# Altium integrated library Lattice CPLD ispLSI.IntLib: 471 symbols (part 23 of 26) (continued)
## ispLSI8600V-125LB492 (continued)
part C pins: E1 I/OG5 <3> (io), E2 I/OG5 <2> (io), E3 I/OG5 <1> (io), E4 I/OG5 <0> (io), F1 I/OG5 <7> (io), F2 I/OG5 <6> (io), F3 I/OG5 <5> (io), F4 I/OG5 <4> (io), F23 I/OG5 <23> (io), F24 I/OG5 <22> (io), F25 I/OG5 <21> (io), F26 I/OG5 <20> (io), G1 I/OG5 <11> (io), G2 I/OG5 <10> (io), G3 I/OG5 <9> (io), G4 I/OG5 <8> (io), G23 I/OG5 <19> (io), G24 I/OG5 <18> (io), G25 I/OG5 <17> (io), G26 I/OG5 <16> (io), H1 I/OG4 <6> (io), H2 I/OG4 <8> (io), H3 I/OG4 <9> (io), H4 I/OG4 <10> (io), H5 I/OG4 <1> (io), H6 I/OG3 <3> (io), H21 I/OG3 <20> (io), H22 I/OG4 <21> (io), H23 I/OG5 <15> (io), H24 I/OG5 <14> (io), H25 I/OG5 <13> (io), H26 I/OG4 <12> (io), J1 I/OG4 <2> (io), J2 I/OG4 <3> (io), J3 I/OG4 <4> (io), J4 I/OG4 <5> (io), J5 I/OG4 <7> (io), J22 I/OG4 <16> (io), J23 I/OG4 <13> (io), J24 I/OG4 <14> (io), J25 I/OG4 <15> (io), J26 I/OG4 <17> (io), K1 I/OG3 <1> (io), K2 I/OG3 <0> (io), K4 I/OG4 <0> (io), K6 I/OG4 <11> (io), K21 I/OG5 <12> (io), K23 I/OG4 <18> (io), K24 I/OG4 <19> (io), K25 I/OG4 <20> (io), K26 I/OG4 <22> (io), L1 I/OG3 <6> (io), L2 I/OG3 <2> (io), L3 I/OG3 <4> (io), L4 I/OG3 <5> (io), L23 I/OG3 <23> (io), L25 I/OG4 <23> (io), L26 I/OG3 <22> (io), M1 I/OG3 <8> (io), M2 I/OG3 <7> (io), M3 I/OG3 <9> (io), M4 I/OG3 <10> (io), M22 I/OG3 <16> (io), M23 I/OG3 <17> (io), M24 I/OG3 <18> (io), M25 I/OG3 <21> (io), M26 I/OG3 <19> (io), N2 I/OG3 <11> (io), N4 I/OG2 <11> (io), N23 I/OG3 <12> (io), N24 I/OG3 <13> (io), N25 I/OG3 <15> (io), N26 I/OG3 <14> (io), P1 I/OG2 <8> (io), P3 I/OG2 <9> (io), P4 I/OG2 <10> (io), P25 I/OG2 <13> (io), P26 I/OG2 <12> (io), R1 I/OG2 <4> (io), R2 I/OG2 <3> (io), R3 I/OG2 <5> (io), R4 I/OG2 <6> (io), R5 I/OG2 <7> (io), R23 I/OG2 <14> (io), R25 I/OG2 <17> (io), R26 I/OG2 <16> (io), T1 I/OG2 <1> (io), T4 I/OG2 <0> (io), T22 I/OG2 <15> (io), T23 I/OG2 <19> (io), T24 I/OG2 <21> (io), T25 I/OG2 <22> (io), T26 I/OG2 <18> (io), U26 I/OG2 <23> (io), W6 I/OG2 <2> (io), W21 I/OG2 <20> (io)
part D pins: A1 NC, A6 NC, A7 NC, A8 NC, A16 NC, A20 NC, A21 NC, A22 NC, AA8 NC, AA9 NC, AA18 NC, AA19 NC, AB1 NC, AB2 NC, AB3 NC, AB4 NC, AB6 NC, AB10 NC, AB20 NC, AB21 NC, AB23 NC, AC1 NC, AC2 NC, AC3 NC, AC6 NC, AC7 NC, AC8 NC, AC18 NC, AC19 NC, AC20 NC, AC23 NC, AC24 NC, AC25 NC, AC26 NC, AD1 NC, AD2 NC, AD3 NC, AD6 NC, AD7 NC, AD8 NC, AD15 NC, AD19 NC, AD20 NC, AD25 NC, AD26 NC, AE1 NC, AE6 NC, AE7 NC, AE8 NC, AE19 NC, AE20 NC, AE21 NC, AE25 NC, AE26 NC, AF6 NC, AF7 NC, AF8 NC, AF19 NC, AF20 NC, AF21 NC, AF25 NC, AF26 NC, B1 NC, B2 NC, B7 NC, B8 NC, B9 NC, B20 NC, B21 NC, C1 NC, C2 NC, C3 NC, C7 NC, C8 NC, C9 NC, C19 NC, C20 NC, C21 NC, C24 NC, C25 NC, C26 NC, D1 NC, D2 NC, D3 NC, D4 NC, D7 NC, D8 NC, D9 NC, D19 NC, D20 NC, D21 NC, D24 NC, D25 NC, D26 NC, E6 NC, E17 NC, E20 NC, E21 NC, E23 NC, E24 NC, E25 NC, E26 NC, F8 NC, F9 NC, F18 NC, F19 NC, G6 NC, G21 NC, Y6 NC, Y21 NC
part E pins: AA5 VCC (power), AA6 GND (power), AA7 VCCIO (power), AA10 VCC (power), AA17 VCC (power), AA20 VCCIO (power), AA21 GND (power), AA22 VCC (power), AB5 GND (power), AB8 VCCIO (power), AB9 VCC (power), AB12 VCC (power), AB13 GND (power), AB14 VCCIO (power), AB15 VCC (power), AB16 GND (power), AB18 VCC (power), AB19 VCCIO (power), AB22 GND (power), E5 GND (power), E8 VCCIO (power), E9 VCC (power), E11 GND (power), E12 VCC (power), E13 VCCIO (power), E14 GND (power), E15 VCC (power), E18 VCC (power), E19 VCCIO (power), E22 GND (power), F5 VCC (power), F6 GND (power), F7 VCCIO (power), F10 VCC (power), F17 VCC (power), F20 VCCIO (power), F21 GND (power), F22 VCC (power), G5 VCC (power), G22 VCC (power), J6 VCCIO (power), J21 VCCIO (power), K3 VCCIO (power), K5 VCC (power), K22 VCC (power), L11 GND (power), L12 GND (power), L13 GND (power), L14 GND (power), L15 GND (power), L16 GND (power), L22 VCC (power), L24 VCCIO (power), M5 VCC (power), M11 GND (power), M12 GND (power), M13 GND (power), M14 GND (power), M15 GND (power), M16 GND (power), N1 VCCIO (power), N11 GND (power), N12 GND (power), N13 GND (power), N14 GND (power), N15 GND (power), N16 GND (power), N22 VCC (power), P5 VCC (power), P11 GND (power), P12 GND (power), P13 GND (power), P14 GND (power), P15 GND (power), P16 GND (power), P24 VCCIO (power), R11 GND (power), R12 GND (power), R13 GND (power), R14 GND (power), R15 GND (power), R16 GND (power), R22 VCC (power), T3 VCCIO (power), T5 VCC (power), T11 GND (power), T12 GND (power), T13 GND (power), T14 GND (power), T15 GND (power), T16 GND (power), U5 VCC (power), U22 VCC (power), U25 VCCIO (power), V6 VCCIO (power), Y5 VCC (power), Y22 VCC (power), Y23 VCCIO (power)

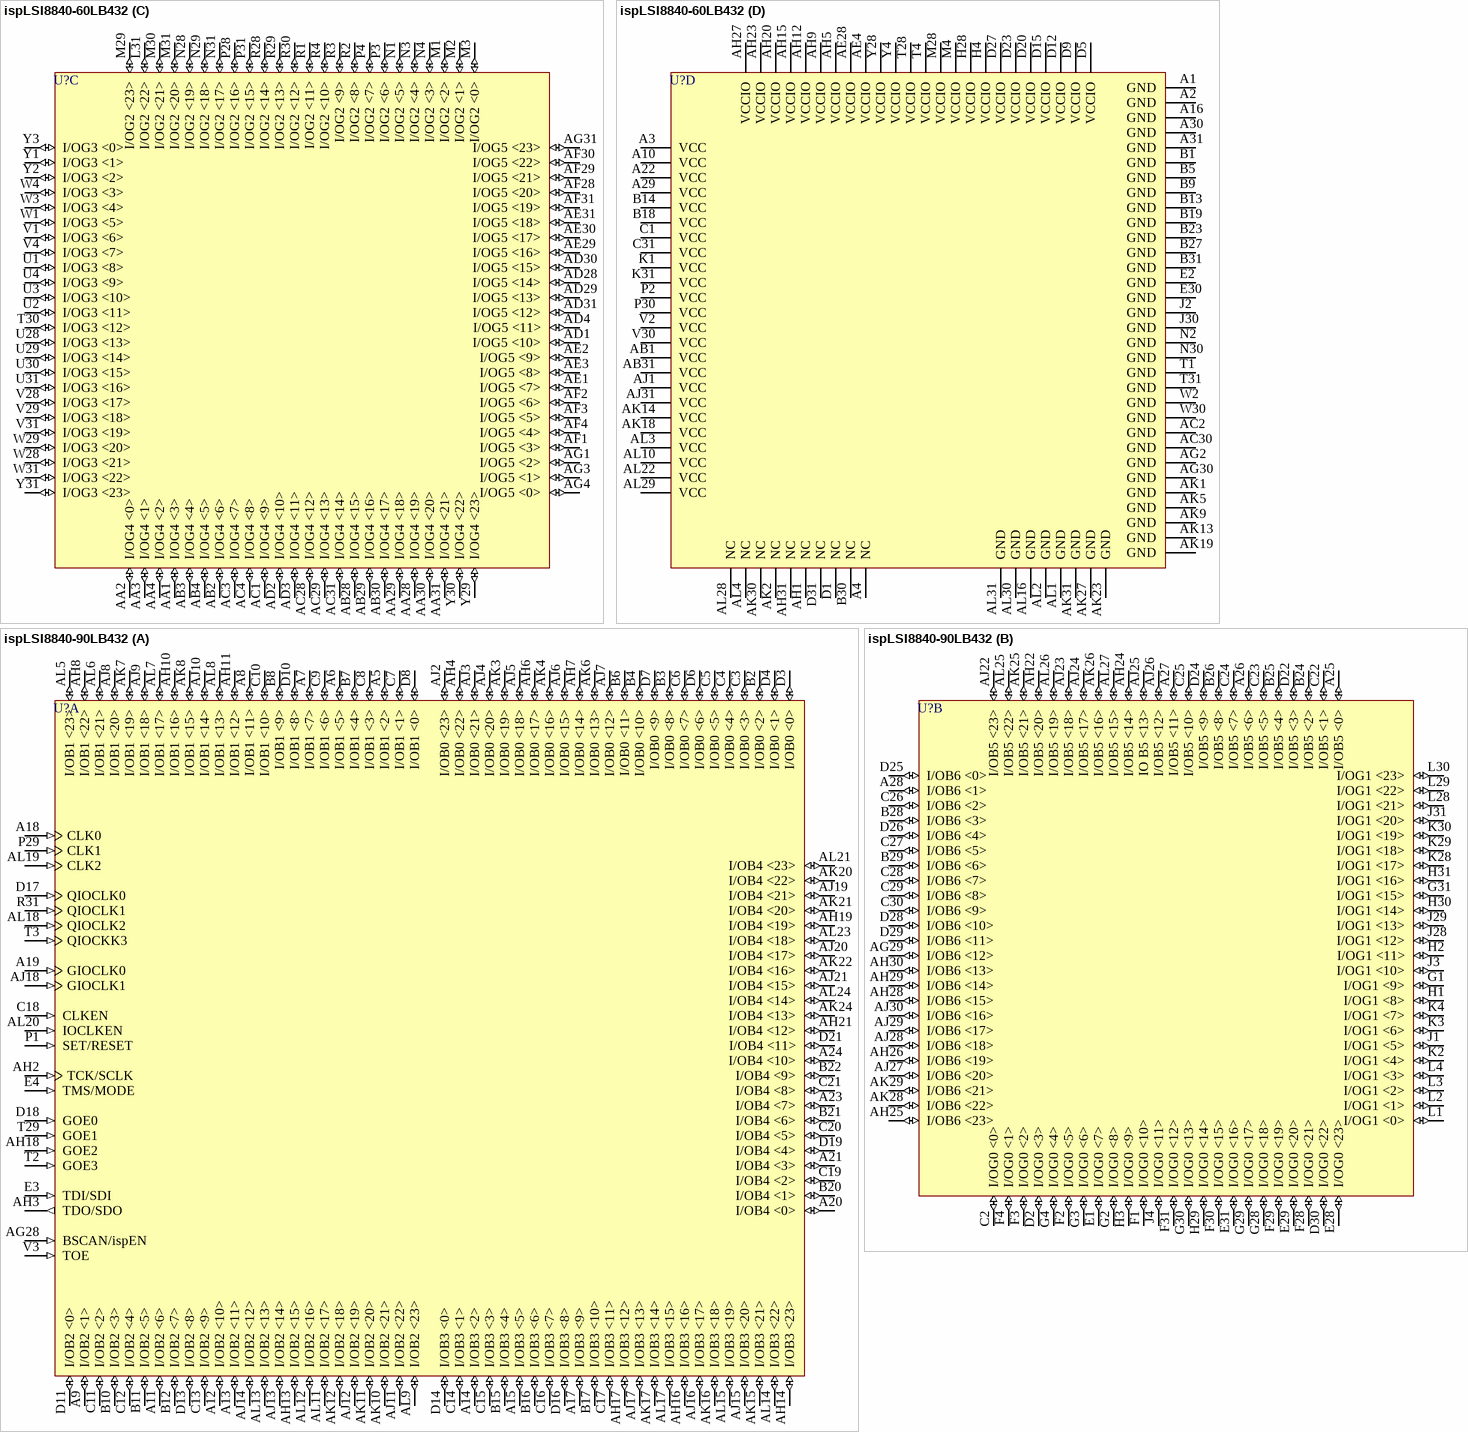
[diagram p219: symbols ispLSI8840-60LB432 to ispLSI8840-90LB432]

## ispLSI8840-60LB432
designator U?
In-System Programmable SuperBIG High Density PLD; Published: 17-Jul-2002; LatestRevisionDate: 13-Apr-2006; LatestRevisionNote: IPC-7351 Footprint Added.; DatasheetVersion: Jan-2000; PackageVersion: pkg_32, Aug-2005; PackageReference: SBGA432; Publisher: Altium Limited; PackageDescription: 432-Ball Super Ball Grid Array (SBGA432); ComponentLink1Description: Manufacturer Link; ComponentLink1URL: http://www.latticesemi.com/products/mature/index.cfm; ComponentLink2Description: Datasheet; ComponentLink2URL: http://www.latticesemi.com/lit/docs/datasheets/cpld/8840.pdf
footprint SBGA432 (BGA, 432-Leads, Body 40x40mm, Pitch 1.27mm)
3D model 8840-SBGA432 (432-Ball Super Ball Grid Array (SBGA432))
part A pins: A5 I/OB1 <2> (io), A6 I/OB1 <5> (io), A7 I/OB1 <7> (io), A8 I/OB1 <11> (io), A9 I/OB2 <1> (io), A11 I/OB2 <6> (io), A12 I/OB2 <10> (io), A13 I/OB2 <11> (io), A14 I/OB3 <2> (io), A15 I/OB3 <5> (io), A17 I/OB3 <9> (io), A18 CLK0 (in), A19 GIOCLK0 (in), A20 I/OB4 <0> (io), A21 I/OB4 <3> (io), A23 I/OB4 <7> (io), A24 I/OB4 <10> (io), AG28 BSCAN/ispEN (in), AH2 TCK/SCLK (in), AH3 TDO/SDO (out), AH4 I/OB0 <22> (io), AH6 I/OB0 <17> (io), AH7 I/OB0 <14> (io), AH8 I/OB1 <22> (io), AH10 I/OB1 <16> (io), AH11 I/OB1 <12> (io), AH13 I/OB2 <15> (io), AH14 I/OB3 <23> (io), AH16 I/OB3 <16> (io), AH17 I/OB3 <12> (io), AH18 GOE2 (in), AH19 I/OB4 <19> (io), AH21 I/OB4 <12> (io), AJ2 I/OB0 <23> (io), AJ3 I/OB0 <21> (io), AJ4 I/OB0 <20> (io), AJ5 I/OB0 <18> (io), AJ6 I/OB0 <15> (io), AJ7 I/OB0 <12> (io), AJ8 I/OB1 <20> (io), AJ9 I/OB1 <18> (io), AJ10 I/OB1 <14> (io), AJ11 I/OB2 <22> (io), AJ12 I/OB2 <19> (io), AJ13 I/OB2 <14> (io), AJ14 I/OB2 <12> (io), AJ15 I/OB3 <20> (io), AJ16 I/OB3 <17> (io), AJ17 I/OB3 <13> (io), AJ18 GIOCLK1 (in), AJ19 I/OB4 <21> (io), AJ20 I/OB4 <17> (io), AJ21 I/OB4 <15> (io), AK3 I/OB0 <19> (io), AK4 I/OB0 <16> (io), AK6 I/OB0 <13> (io), AK7 I/OB1 <19> (io), AK8 I/OB1 <15> (io), AK10 I/OB2 <21> (io), AK11 I/OB2 <20> (io), AK12 I/OB2 <18> (io), AK15 I/OB3 <21> (io), AK16 I/OB3 <18> (io), AK17 I/OB3 <14> (io), AK20 I/OB4 <22> (io), AK21 I/OB4 <20> (io), AK22 I/OB4 <16> (io), AK24 I/OB4 <13> (io), AL5 I/OB1 <23> (io), AL6 I/OB1 <21> (io), AL7 I/OB1 <17> (io), AL8 I/OB1 <13> (io), AL9 I/OB2 <23> (io), AL11 I/OB2 <17> (io), AL12 I/OB2 <16> (io), AL13 I/OB2 <13> (io), AL14 I/OB3 <22> (io), AL15 I/OB3 <19> (io), AL17 I/OB3 <15> (io), AL18 QIOCLK2 (in), AL19 CLK2 (in), AL20 IOCLKEN (in), AL21 I/OB4 <23> (io), AL23 I/OB4 <18> (io), AL24 I/OB4 <14> (io), B2 I/OB0 <2> (io), B3 I/OB0 <8> (io), B4 I/OB0 <10> (io), B6 I/OB0 <11> (io), B7 I/OB1 <4> (io), B8 I/OB1 <9> (io), B10 I/OB2 <3> (io), B11 I/OB2 <5> (io), B12 I/OB2 <7> (io), B15 I/OB3 <4> (io), B16 I/OB3 <6> (io), B17 I/OB3 <10> (io), B20 I/OB4 <1> (io), B21 I/OB4 <6> (io), B22 I/OB4 <9> (io), C3 I/OB0 <3> (io), C4 I/OB0 <4> (io), C5 I/OB0 <5> (io), C6 I/OB0 <7> (io), C7 I/OB1 <1> (io), C8 I/OB1 <3> (io), C9 I/OB1 <6> (io), C10 I/OB1 <10> (io), C11 I/OB2 <2> (io), C12 I/OB2 <4> (io), C13 I/OB2 <9> (io), C14 I/OB3 <1> (io), C15 I/OB3 <3> (io), C16 I/OB3 <7> (io), C17 I/OB3 <11> (io), C18 CLKEN (in), C19 I/OB4 <2> (io), C20 I/OB4 <5> (io), C21 I/OB4 <8> (io), D3 I/OB0 <0> (io), D4 I/OB0 <1> (io), D6 I/OB0 <6> (io), D7 I/OB0 <9> (io), D8 I/OB1 <0> (io), D10 I/OB1 <8> (io), D11 I/OB2 <0> (io), D13 I/OB2 <8> (io), D14 I/OB3 <0> (io), D16 I/OB3 <8> (io), D17 QIOCLK0 (in), D18 GOE0 (in), D19 I/OB4 <4> (io), D21 I/OB4 <11> (io), E3 TDI/SDI (in), E4 TMS/MODE (in), P1 SET/RESET (in), P29 CLK1 (in), R31 QIOCLK1 (in), T2 GOE3 (in), T3 QIOCKK3 (in), T29 GOE1 (in), V3 TOE (in)
part B pins: A25 I/OB5 <0> (io), A26 I/OB5 <6> (io), A27 I/OB5 <11> (io), A28 I/OB6 <1> (io), AG29 I/OB6 <12> (io), AH22 I/OB5 <20> (io), AH24 I/OB5 <14> (io), AH25 I/OB6 <23> (io), AH26 I/OB6 <19> (io), AH28 I/OB6 <15> (io), AH29 I/OB6 <14> (io), AH30 I/OB6 <13> (io), AJ22 I/OB5 <23> (io), AJ23 I/OB5 <18> (io), AJ24 I/OB5 <17> (io), AJ25 IO B5 <13> (io), AJ26 I/OB5 <12> (io), AJ27 I/OB6 <20> (io), AJ28 I/OB6 <18> (io), AJ29 I/OB6 <17> (io), AJ30 I/OB6 <16> (io), AK25 I/OB5 <21> (io), AK26 I/OB5 <16> (io), AK28 I/OB6 <22> (io), AK29 I/OB6 <21> (io), AL25 I/OB5 <22> (io), AL26 I/OB5 <19> (io), AL27 I/OB5 <15> (io), B24 I/OB5 <2> (io), B25 I/OB5 <4> (io), B26 I/OB5 <8> (io), B28 I/OB6 <3> (io), B29 I/OB6 <6> (io), C2 I/OG0 <0> (io), C22 I/OB5 <1> (io), C23 I/OB5 <5> (io), C24 I/OB5 <7> (io), C25 I/OB5 <10> (io), C26 I/OB6 <2> (io), C27 I/OB6 <5> (io), C28 I/OB6 <7> (io), C29 I/OB6 <8> (io), C30 I/OB6 <9> (io), D2 I/OG0 <3> (io), D22 I/OB5 <3> (io), D24 I/OB5 <9> (io), D25 I/OB6 <0> (io), D26 I/OB6 <4> (io), D28 I/OB6 <10> (io), D29 I/OB6 <11> (io), D30 I/OG0 <22> (io), E1 I/OG0 <7> (io), E28 I/OG0 <23> (io), E29 I/OG0 <20> (io), E31 I/OG0 <16> (io), F1 I/OG0 <10> (io), F2 I/OG0 <5> (io), F3 I/OG0 <2> (io), F4 I/OG0 <1> (io), F28 I/OG0 <21> (io), F29 I/OG0 <19> (io), F30 I/OG0 <15> (io), F31 I/OG0 <12> (io), G1 I/OG1 <9> (io), G2 I/OG0 <8> (io), G3 I/OG0 <6> (io), G4 I/OG0 <4> (io), G28 I/OG0 <18> (io), G29 I/OG0 <17> (io), G30 I/OG0 <13> (io), G31 I/OG1 <15> (io), H1 I/OG1 <8> (io), H2 I/OG1 <11> (io), H3 I/OG0 <9> (io), H29 I/OG0 <14> (io), H30 I/OG1 <14> (io), H31 I/OG1 <16> (io), J1 I/OG1 <5> (io), J3 I/OG1 <10> (io), J4 I/OG0 <11> (io), J28 I/OG1 <12> (io), J29 I/OG1 <13> (io), J31 I/OG1 <20> (io), K2 I/OG1 <4> (io), K3 I/OG1 <6> (io), K4 I/OG1 <7> (io), K28 I/OG1 <17> (io), K29 I/OG1 <18> (io), K30 I/OG1 <19> (io), L1 I/OG1 <0> (io), L2 I/OG1 <1> (io), L3 I/OG1 <2> (io), L4 I/OG1 <3> (io), L28 I/OG1 <21> (io), L29 I/OG1 <22> (io), L30 I/OG1 <23> (io)
part C pins: AA1 I/OG4 <3> (io), AA2 I/OG4 <0> (io), AA3 I/OG4 <1> (io), AA4 I/OG4 <2> (io), AA28 I/OG4 <19> (io), AA29 I/OG4 <18> (io), AA30 I/OG4 <20> (io), AA31 I/OG4 <21> (io), AB2 I/OG4 <6> (io), AB3 I/OG4 <4> (io), AB4 I/OG4 <5> (io), AB28 I/OG4 <15> (io), AB29 I/OG4 <16> (io), AB30 I/OG4 <17> (io), AC1 I/OG4 <9> (io), AC3 I/OG4 <7> (io), AC4 I/OG4 <8> (io), AC28 I/OG4 <12> (io), AC29 I/OG4 <13> (io), AC31 I/OG4 <14> (io), AD1 I/OG5 <10> (io), AD2 I/OG4 <10> (io), AD3 I/OG4 <11> (io), AD4 I/OG5 <11> (io), AD28 I/OG5 <14> (io), AD29 I/OG5 <13> (io), AD30 I/OG5 <15> (io), AD31 I/OG5 <12> (io), AE1 I/OG5 <7> (io), AE2 I/OG5 <9> (io), AE3 I/OG5 <8> (io), AE29 I/OG5 <16> (io), AE30 I/OG5 <17> (io), AE31 I/OG5 <18> (io), AF1 I/OG5 <3> (io), AF2 I/OG5 <6> (io), AF3 I/OG5 <5> (io), AF4 I/OG5 <4> (io), AF28 I/OG5 <20> (io), AF29 I/OG5 <21> (io), AF30 I/OG5 <22> (io), AF31 I/OG5 <19> (io), AG1 I/OG5 <2> (io), AG3 I/OG5 <1> (io), AG4 I/OG5 <0> (io), AG31 I/OG5 <23> (io), L31 I/OG2 <22> (io), M1 I/OG2 <2> (io), M2 I/OG2 <1> (io), M3 I/OG2 <0> (io), M29 I/OG2 <23> (io), M30 I/OG2 <21> (io), M31 I/OG2 <20> (io), N1 I/OG2 <5> (io), N3 I/OG2 <4> (io), N4 I/OG2 <3> (io), N28 I/OG2 <19> (io), N29 I/OG2 <18> (io), N31 I/OG2 <17> (io), P3 I/OG2 <6> (io), P4 I/OG2 <7> (io), P28 I/OG2 <16> (io), P31 I/OG2 <15> (io), R1 I/OG2 <11> (io), R2 I/OG2 <8> (io), R3 I/OG2 <9> (io), R4 I/OG2 <10> (io), R28 I/OG2 <14> (io), R29 I/OG2 <13> (io), R30 I/OG2 <12> (io), T30 I/OG3 <12> (io), U1 I/OG3 <8> (io), U2 I/OG3 <11> (io), U3 I/OG3 <10> (io), U4 I/OG3 <9> (io), U28 I/OG3 <13> (io), U29 I/OG3 <14> (io), U30 I/OG3 <15> (io), U31 I/OG3 <16> (io), V1 I/OG3 <6> (io), V4 I/OG3 <7> (io), V28 I/OG3 <17> (io), V29 I/OG3 <18> (io), V31 I/OG3 <19> (io), W1 I/OG3 <5> (io), W3 I/OG3 <4> (io), W4 I/OG3 <3> (io), W28 I/OG3 <21> (io), W29 I/OG3 <20> (io), W31 I/OG3 <22> (io), Y1 I/OG3 <1> (io), Y2 I/OG3 <2> (io), Y3 I/OG3 <0> (io), Y29 I/OG4 <23> (io), Y30 I/OG4 <22> (io), Y31 I/OG3 <23> (io)
part D pins: A1 GND (power), A2 GND (power), A3 VCC (power), A4 NC, A10 VCC (power), A16 GND (power), A22 VCC (power), A29 VCC (power), A30 GND (power), A31 GND (power), AB1 VCC (power), AB31 VCC (power), AC2 GND (power), AC30 GND (power), AE4 VCCIO (power), AE28 VCCIO (power), AG2 GND (power), AG30 GND (power), AH1 NC, AH5 VCCIO (power), AH9 VCCIO (power), AH12 VCCIO (power), AH15 VCCIO (power), AH20 VCCIO (power), AH23 VCCIO (power), AH27 VCCIO (power), AH31 NC, AJ1 VCC (power), AJ31 VCC (power), AK1 GND (power), AK2 NC, AK5 GND (power), AK9 GND (power), AK13 GND (power), AK14 VCC (power), AK18 VCC (power), AK19 GND (power), AK23 GND (power), AK27 GND (power), AK30 NC, AK31 GND (power), AL1 GND (power), AL2 GND (power), AL3 VCC (power), AL4 NC, AL10 VCC (power), AL16 GND (power), AL22 VCC (power), AL28 NC, AL29 VCC (power), AL30 GND (power), AL31 GND (power), B1 GND (power), B5 GND (power), B9 GND (power), B13 GND (power), B14 VCC (power), B18 VCC (power), B19 GND (power), B23 GND (power), B27 GND (power), B30 NC, B31 GND (power), C1 VCC (power), C31 VCC (power), D1 NC, D5 VCCIO (power), D9 VCCIO (power), D12 VCCIO (power), D15 VCCIO (power), D20 VCCIO (power), D23 VCCIO (power), D27 VCCIO (power), D31 NC, E2 GND (power), E30 GND (power), H4 VCCIO (power), H28 VCCIO (power), J2 GND (power), J30 GND (power), K1 VCC (power), K31 VCC (power), M4 VCCIO (power), M28 VCCIO (power), N2 GND (power), N30 GND (power), P2 VCC (power), P30 VCC (power), T1 GND (power), T4 VCCIO (power), T28 VCCIO (power), T31 GND (power), V2 VCC (power), V30 VCC (power), W2 GND (power), W30 GND (power), Y4 VCCIO (power), Y28 VCCIO (power)

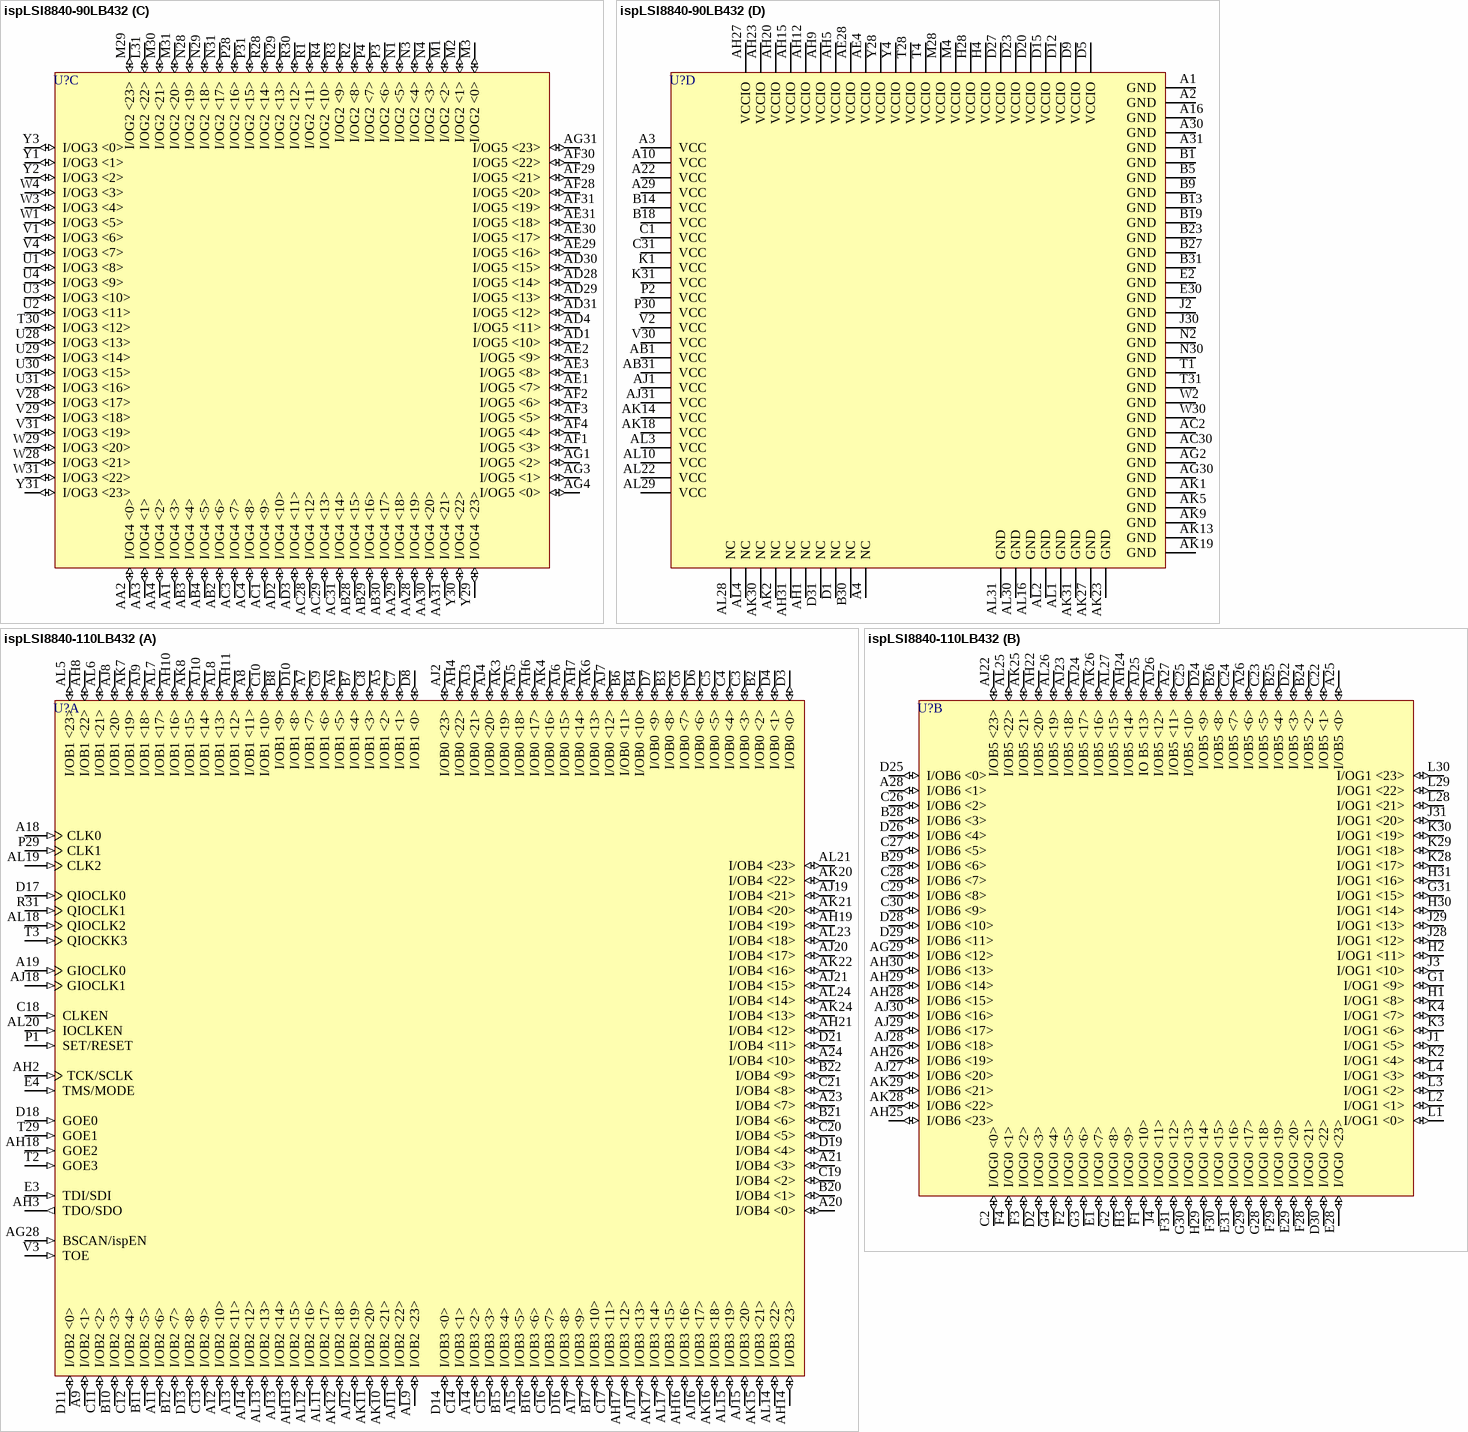
[diagram p220: symbols ispLSI8840-90LB432 to ispLSI8840-110LB432]

## ispLSI8840-90LB432
designator U?
In-System Programmable SuperBIG High Density PLD; Published: 17-Jul-2002; LatestRevisionDate: 13-Apr-2006; LatestRevisionNote: IPC-7351 Footprint Added.; DatasheetVersion: Jan-2000; PackageVersion: pkg_32, Aug-2005; PackageReference: SBGA432; Publisher: Altium Limited; PackageDescription: 432-Ball Super Ball Grid Array (SBGA432); ComponentLink1Description: Manufacturer Link; ComponentLink1URL: http://www.latticesemi.com/products/mature/index.cfm; ComponentLink2Description: Datasheet; ComponentLink2URL: http://www.latticesemi.com/lit/docs/datasheets/cpld/8840.pdf
footprint SBGA432 (BGA, 432-Leads, Body 40x40mm, Pitch 1.27mm)
3D model 8840-SBGA432 (432-Ball Super Ball Grid Array (SBGA432))
part A pins: A5 I/OB1 <2> (io), A6 I/OB1 <5> (io), A7 I/OB1 <7> (io), A8 I/OB1 <11> (io), A9 I/OB2 <1> (io), A11 I/OB2 <6> (io), A12 I/OB2 <10> (io), A13 I/OB2 <11> (io), A14 I/OB3 <2> (io), A15 I/OB3 <5> (io), A17 I/OB3 <9> (io), A18 CLK0 (in), A19 GIOCLK0 (in), A20 I/OB4 <0> (io), A21 I/OB4 <3> (io), A23 I/OB4 <7> (io), A24 I/OB4 <10> (io), AG28 BSCAN/ispEN (in), AH2 TCK/SCLK (in), AH3 TDO/SDO (out), AH4 I/OB0 <22> (io), AH6 I/OB0 <17> (io), AH7 I/OB0 <14> (io), AH8 I/OB1 <22> (io), AH10 I/OB1 <16> (io), AH11 I/OB1 <12> (io), AH13 I/OB2 <15> (io), AH14 I/OB3 <23> (io), AH16 I/OB3 <16> (io), AH17 I/OB3 <12> (io), AH18 GOE2 (in), AH19 I/OB4 <19> (io), AH21 I/OB4 <12> (io), AJ2 I/OB0 <23> (io), AJ3 I/OB0 <21> (io), AJ4 I/OB0 <20> (io), AJ5 I/OB0 <18> (io), AJ6 I/OB0 <15> (io), AJ7 I/OB0 <12> (io), AJ8 I/OB1 <20> (io), AJ9 I/OB1 <18> (io), AJ10 I/OB1 <14> (io), AJ11 I/OB2 <22> (io), AJ12 I/OB2 <19> (io), AJ13 I/OB2 <14> (io), AJ14 I/OB2 <12> (io), AJ15 I/OB3 <20> (io), AJ16 I/OB3 <17> (io), AJ17 I/OB3 <13> (io), AJ18 GIOCLK1 (in), AJ19 I/OB4 <21> (io), AJ20 I/OB4 <17> (io), AJ21 I/OB4 <15> (io), AK3 I/OB0 <19> (io), AK4 I/OB0 <16> (io), AK6 I/OB0 <13> (io), AK7 I/OB1 <19> (io), AK8 I/OB1 <15> (io), AK10 I/OB2 <21> (io), AK11 I/OB2 <20> (io), AK12 I/OB2 <18> (io), AK15 I/OB3 <21> (io), AK16 I/OB3 <18> (io), AK17 I/OB3 <14> (io), AK20 I/OB4 <22> (io), AK21 I/OB4 <20> (io), AK22 I/OB4 <16> (io), AK24 I/OB4 <13> (io), AL5 I/OB1 <23> (io), AL6 I/OB1 <21> (io), AL7 I/OB1 <17> (io), AL8 I/OB1 <13> (io), AL9 I/OB2 <23> (io), AL11 I/OB2 <17> (io), AL12 I/OB2 <16> (io), AL13 I/OB2 <13> (io), AL14 I/OB3 <22> (io), AL15 I/OB3 <19> (io), AL17 I/OB3 <15> (io), AL18 QIOCLK2 (in), AL19 CLK2 (in), AL20 IOCLKEN (in), AL21 I/OB4 <23> (io), AL23 I/OB4 <18> (io), AL24 I/OB4 <14> (io), B2 I/OB0 <2> (io), B3 I/OB0 <8> (io), B4 I/OB0 <10> (io), B6 I/OB0 <11> (io), B7 I/OB1 <4> (io), B8 I/OB1 <9> (io), B10 I/OB2 <3> (io), B11 I/OB2 <5> (io), B12 I/OB2 <7> (io), B15 I/OB3 <4> (io), B16 I/OB3 <6> (io), B17 I/OB3 <10> (io), B20 I/OB4 <1> (io), B21 I/OB4 <6> (io), B22 I/OB4 <9> (io), C3 I/OB0 <3> (io), C4 I/OB0 <4> (io), C5 I/OB0 <5> (io), C6 I/OB0 <7> (io), C7 I/OB1 <1> (io), C8 I/OB1 <3> (io), C9 I/OB1 <6> (io), C10 I/OB1 <10> (io), C11 I/OB2 <2> (io), C12 I/OB2 <4> (io), C13 I/OB2 <9> (io), C14 I/OB3 <1> (io), C15 I/OB3 <3> (io), C16 I/OB3 <7> (io), C17 I/OB3 <11> (io), C18 CLKEN (in), C19 I/OB4 <2> (io), C20 I/OB4 <5> (io), C21 I/OB4 <8> (io), D3 I/OB0 <0> (io), D4 I/OB0 <1> (io), D6 I/OB0 <6> (io), D7 I/OB0 <9> (io), D8 I/OB1 <0> (io), D10 I/OB1 <8> (io), D11 I/OB2 <0> (io), D13 I/OB2 <8> (io), D14 I/OB3 <0> (io), D16 I/OB3 <8> (io), D17 QIOCLK0 (in), D18 GOE0 (in), D19 I/OB4 <4> (io), D21 I/OB4 <11> (io), E3 TDI/SDI (in), E4 TMS/MODE (in), P1 SET/RESET (in), P29 CLK1 (in), R31 QIOCLK1 (in), T2 GOE3 (in), T3 QIOCKK3 (in), T29 GOE1 (in), V3 TOE (in)
part B pins: A25 I/OB5 <0> (io), A26 I/OB5 <6> (io), A27 I/OB5 <11> (io), A28 I/OB6 <1> (io), AG29 I/OB6 <12> (io), AH22 I/OB5 <20> (io), AH24 I/OB5 <14> (io), AH25 I/OB6 <23> (io), AH26 I/OB6 <19> (io), AH28 I/OB6 <15> (io), AH29 I/OB6 <14> (io), AH30 I/OB6 <13> (io), AJ22 I/OB5 <23> (io), AJ23 I/OB5 <18> (io), AJ24 I/OB5 <17> (io), AJ25 IO B5 <13> (io), AJ26 I/OB5 <12> (io), AJ27 I/OB6 <20> (io), AJ28 I/OB6 <18> (io), AJ29 I/OB6 <17> (io), AJ30 I/OB6 <16> (io), AK25 I/OB5 <21> (io), AK26 I/OB5 <16> (io), AK28 I/OB6 <22> (io), AK29 I/OB6 <21> (io), AL25 I/OB5 <22> (io), AL26 I/OB5 <19> (io), AL27 I/OB5 <15> (io), B24 I/OB5 <2> (io), B25 I/OB5 <4> (io), B26 I/OB5 <8> (io), B28 I/OB6 <3> (io), B29 I/OB6 <6> (io), C2 I/OG0 <0> (io), C22 I/OB5 <1> (io), C23 I/OB5 <5> (io), C24 I/OB5 <7> (io), C25 I/OB5 <10> (io), C26 I/OB6 <2> (io), C27 I/OB6 <5> (io), C28 I/OB6 <7> (io), C29 I/OB6 <8> (io), C30 I/OB6 <9> (io), D2 I/OG0 <3> (io), D22 I/OB5 <3> (io), D24 I/OB5 <9> (io), D25 I/OB6 <0> (io), D26 I/OB6 <4> (io), D28 I/OB6 <10> (io), D29 I/OB6 <11> (io), D30 I/OG0 <22> (io), E1 I/OG0 <7> (io), E28 I/OG0 <23> (io), E29 I/OG0 <20> (io), E31 I/OG0 <16> (io), F1 I/OG0 <10> (io), F2 I/OG0 <5> (io), F3 I/OG0 <2> (io), F4 I/OG0 <1> (io), F28 I/OG0 <21> (io), F29 I/OG0 <19> (io), F30 I/OG0 <15> (io), F31 I/OG0 <12> (io), G1 I/OG1 <9> (io), G2 I/OG0 <8> (io), G3 I/OG0 <6> (io), G4 I/OG0 <4> (io), G28 I/OG0 <18> (io), G29 I/OG0 <17> (io), G30 I/OG0 <13> (io), G31 I/OG1 <15> (io), H1 I/OG1 <8> (io), H2 I/OG1 <11> (io), H3 I/OG0 <9> (io), H29 I/OG0 <14> (io), H30 I/OG1 <14> (io), H31 I/OG1 <16> (io), J1 I/OG1 <5> (io), J3 I/OG1 <10> (io), J4 I/OG0 <11> (io), J28 I/OG1 <12> (io), J29 I/OG1 <13> (io), J31 I/OG1 <20> (io), K2 I/OG1 <4> (io), K3 I/OG1 <6> (io), K4 I/OG1 <7> (io), K28 I/OG1 <17> (io), K29 I/OG1 <18> (io), K30 I/OG1 <19> (io), L1 I/OG1 <0> (io), L2 I/OG1 <1> (io), L3 I/OG1 <2> (io), L4 I/OG1 <3> (io), L28 I/OG1 <21> (io), L29 I/OG1 <22> (io), L30 I/OG1 <23> (io)
part C pins: AA1 I/OG4 <3> (io), AA2 I/OG4 <0> (io), AA3 I/OG4 <1> (io), AA4 I/OG4 <2> (io), AA28 I/OG4 <19> (io), AA29 I/OG4 <18> (io), AA30 I/OG4 <20> (io), AA31 I/OG4 <21> (io), AB2 I/OG4 <6> (io), AB3 I/OG4 <4> (io), AB4 I/OG4 <5> (io), AB28 I/OG4 <15> (io), AB29 I/OG4 <16> (io), AB30 I/OG4 <17> (io), AC1 I/OG4 <9> (io), AC3 I/OG4 <7> (io), AC4 I/OG4 <8> (io), AC28 I/OG4 <12> (io), AC29 I/OG4 <13> (io), AC31 I/OG4 <14> (io), AD1 I/OG5 <10> (io), AD2 I/OG4 <10> (io), AD3 I/OG4 <11> (io), AD4 I/OG5 <11> (io), AD28 I/OG5 <14> (io), AD29 I/OG5 <13> (io), AD30 I/OG5 <15> (io), AD31 I/OG5 <12> (io), AE1 I/OG5 <7> (io), AE2 I/OG5 <9> (io), AE3 I/OG5 <8> (io), AE29 I/OG5 <16> (io), AE30 I/OG5 <17> (io), AE31 I/OG5 <18> (io), AF1 I/OG5 <3> (io), AF2 I/OG5 <6> (io), AF3 I/OG5 <5> (io), AF4 I/OG5 <4> (io), AF28 I/OG5 <20> (io), AF29 I/OG5 <21> (io), AF30 I/OG5 <22> (io), AF31 I/OG5 <19> (io), AG1 I/OG5 <2> (io), AG3 I/OG5 <1> (io), AG4 I/OG5 <0> (io), AG31 I/OG5 <23> (io), L31 I/OG2 <22> (io), M1 I/OG2 <2> (io), M2 I/OG2 <1> (io), M3 I/OG2 <0> (io), M29 I/OG2 <23> (io), M30 I/OG2 <21> (io), M31 I/OG2 <20> (io), N1 I/OG2 <5> (io), N3 I/OG2 <4> (io), N4 I/OG2 <3> (io), N28 I/OG2 <19> (io), N29 I/OG2 <18> (io), N31 I/OG2 <17> (io), P3 I/OG2 <6> (io), P4 I/OG2 <7> (io), P28 I/OG2 <16> (io), P31 I/OG2 <15> (io), R1 I/OG2 <11> (io), R2 I/OG2 <8> (io), R3 I/OG2 <9> (io), R4 I/OG2 <10> (io), R28 I/OG2 <14> (io), R29 I/OG2 <13> (io), R30 I/OG2 <12> (io), T30 I/OG3 <12> (io), U1 I/OG3 <8> (io), U2 I/OG3 <11> (io), U3 I/OG3 <10> (io), U4 I/OG3 <9> (io), U28 I/OG3 <13> (io), U29 I/OG3 <14> (io), U30 I/OG3 <15> (io), U31 I/OG3 <16> (io), V1 I/OG3 <6> (io), V4 I/OG3 <7> (io), V28 I/OG3 <17> (io), V29 I/OG3 <18> (io), V31 I/OG3 <19> (io), W1 I/OG3 <5> (io), W3 I/OG3 <4> (io), W4 I/OG3 <3> (io), W28 I/OG3 <21> (io), W29 I/OG3 <20> (io), W31 I/OG3 <22> (io), Y1 I/OG3 <1> (io), Y2 I/OG3 <2> (io), Y3 I/OG3 <0> (io), Y29 I/OG4 <23> (io), Y30 I/OG4 <22> (io), Y31 I/OG3 <23> (io)
part D pins: A1 GND (power), A2 GND (power), A3 VCC (power), A4 NC, A10 VCC (power), A16 GND (power), A22 VCC (power), A29 VCC (power), A30 GND (power), A31 GND (power), AB1 VCC (power), AB31 VCC (power), AC2 GND (power), AC30 GND (power), AE4 VCCIO (power), AE28 VCCIO (power), AG2 GND (power), AG30 GND (power), AH1 NC, AH5 VCCIO (power), AH9 VCCIO (power), AH12 VCCIO (power), AH15 VCCIO (power), AH20 VCCIO (power), AH23 VCCIO (power), AH27 VCCIO (power), AH31 NC, AJ1 VCC (power), AJ31 VCC (power), AK1 GND (power), AK2 NC, AK5 GND (power), AK9 GND (power), AK13 GND (power), AK14 VCC (power), AK18 VCC (power), AK19 GND (power), AK23 GND (power), AK27 GND (power), AK30 NC, AK31 GND (power), AL1 GND (power), AL2 GND (power), AL3 VCC (power), AL4 NC, AL10 VCC (power), AL16 GND (power), AL22 VCC (power), AL28 NC, AL29 VCC (power), AL30 GND (power), AL31 GND (power), B1 GND (power), B5 GND (power), B9 GND (power), B13 GND (power), B14 VCC (power), B18 VCC (power), B19 GND (power), B23 GND (power), B27 GND (power), B30 NC, B31 GND (power), C1 VCC (power), C31 VCC (power), D1 NC, D5 VCCIO (power), D9 VCCIO (power), D12 VCCIO (power), D15 VCCIO (power), D20 VCCIO (power), D23 VCCIO (power), D27 VCCIO (power), D31 NC, E2 GND (power), E30 GND (power), H4 VCCIO (power), H28 VCCIO (power), J2 GND (power), J30 GND (power), K1 VCC (power), K31 VCC (power), M4 VCCIO (power), M28 VCCIO (power), N2 GND (power), N30 GND (power), P2 VCC (power), P30 VCC (power), T1 GND (power), T4 VCCIO (power), T28 VCCIO (power), T31 GND (power), V2 VCC (power), V30 VCC (power), W2 GND (power), W30 GND (power), Y4 VCCIO (power), Y28 VCCIO (power)

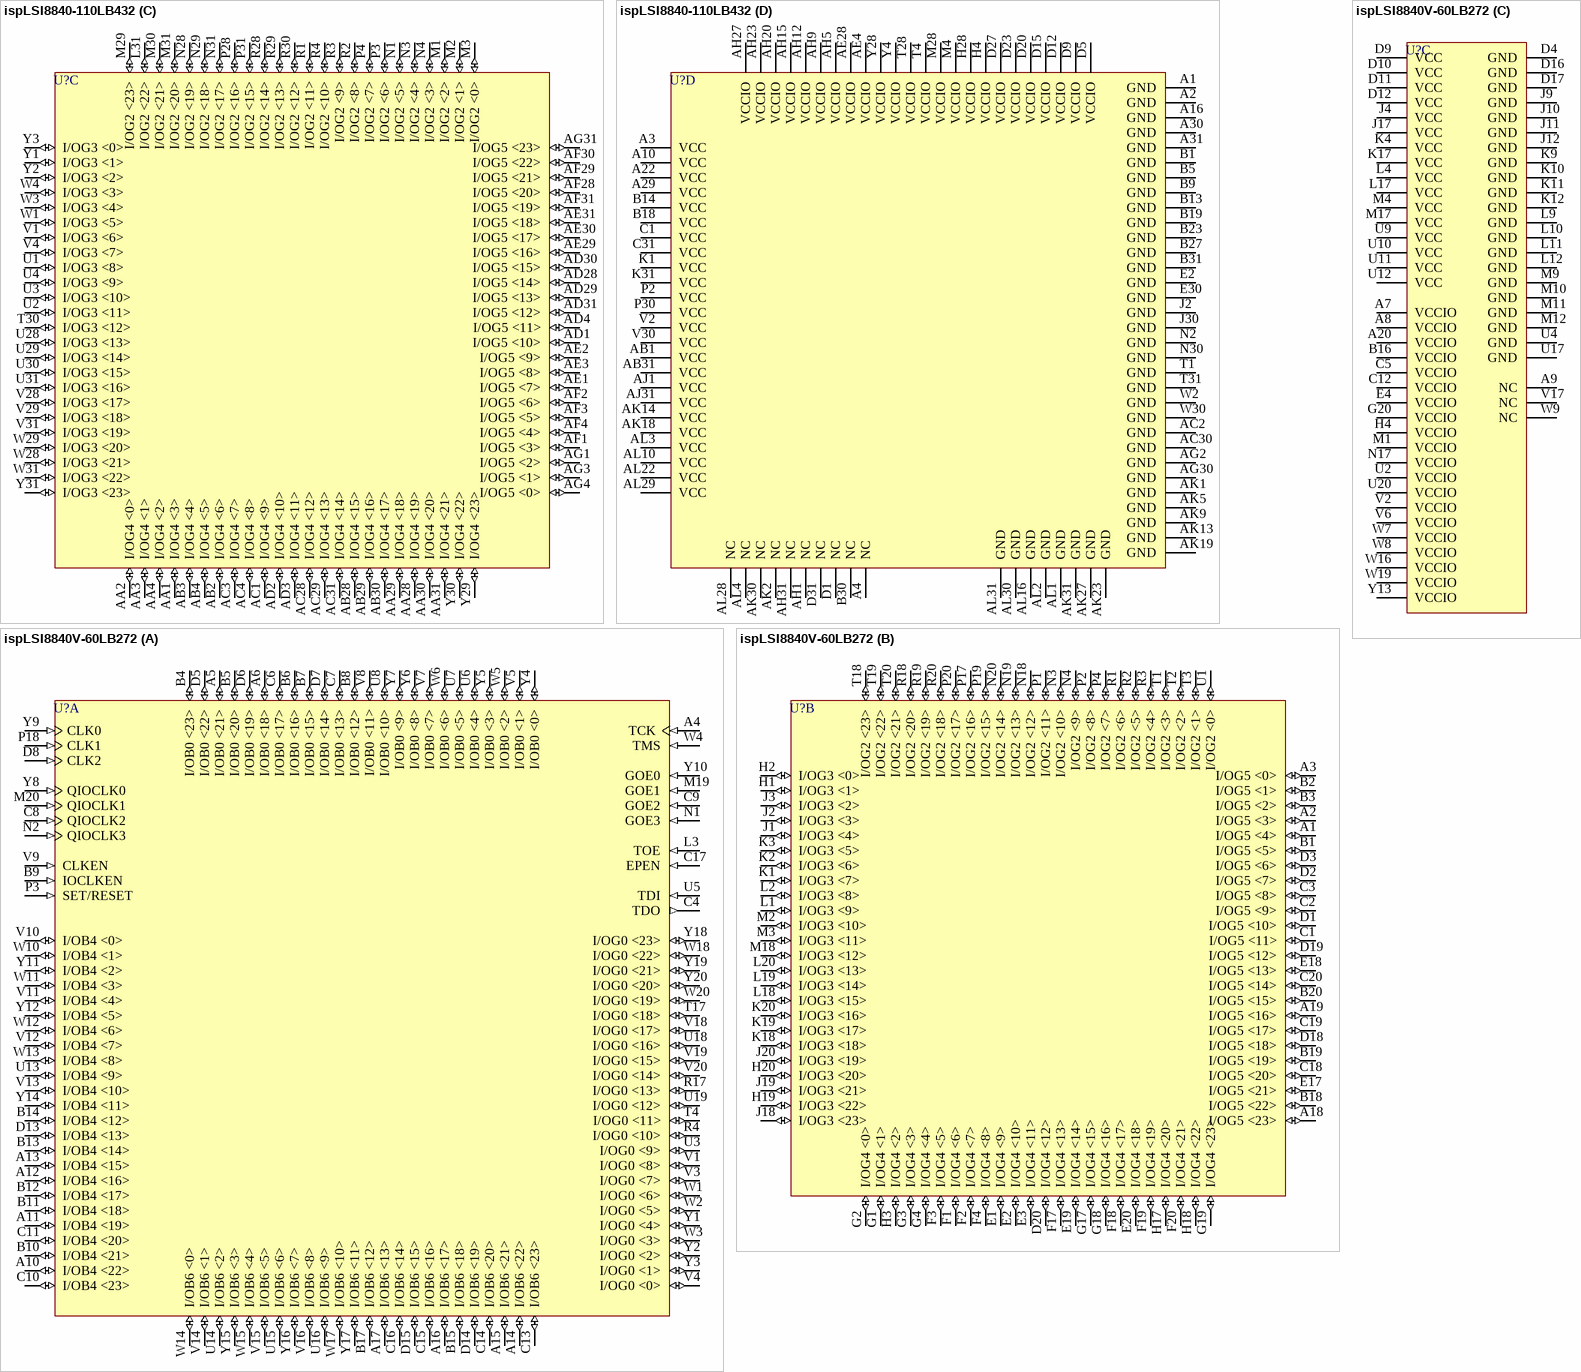
[diagram p221: symbols ispLSI8840-110LB432 to ispLSI8840V-60LB272]